# Altium footprint library MS-Electronic.PcbLib: 202 footprints (part 13 of 13)
Each footprint in its own frame and in the unit in brackets; x right, y up, seen from the top. Pads: shape width x height; smd on the part's side, far side on the other; paste and mask are expansions set on the pad; w line width, h text height; cw(c..) or ccw(c..) is an arc to the next point about the centre after c.
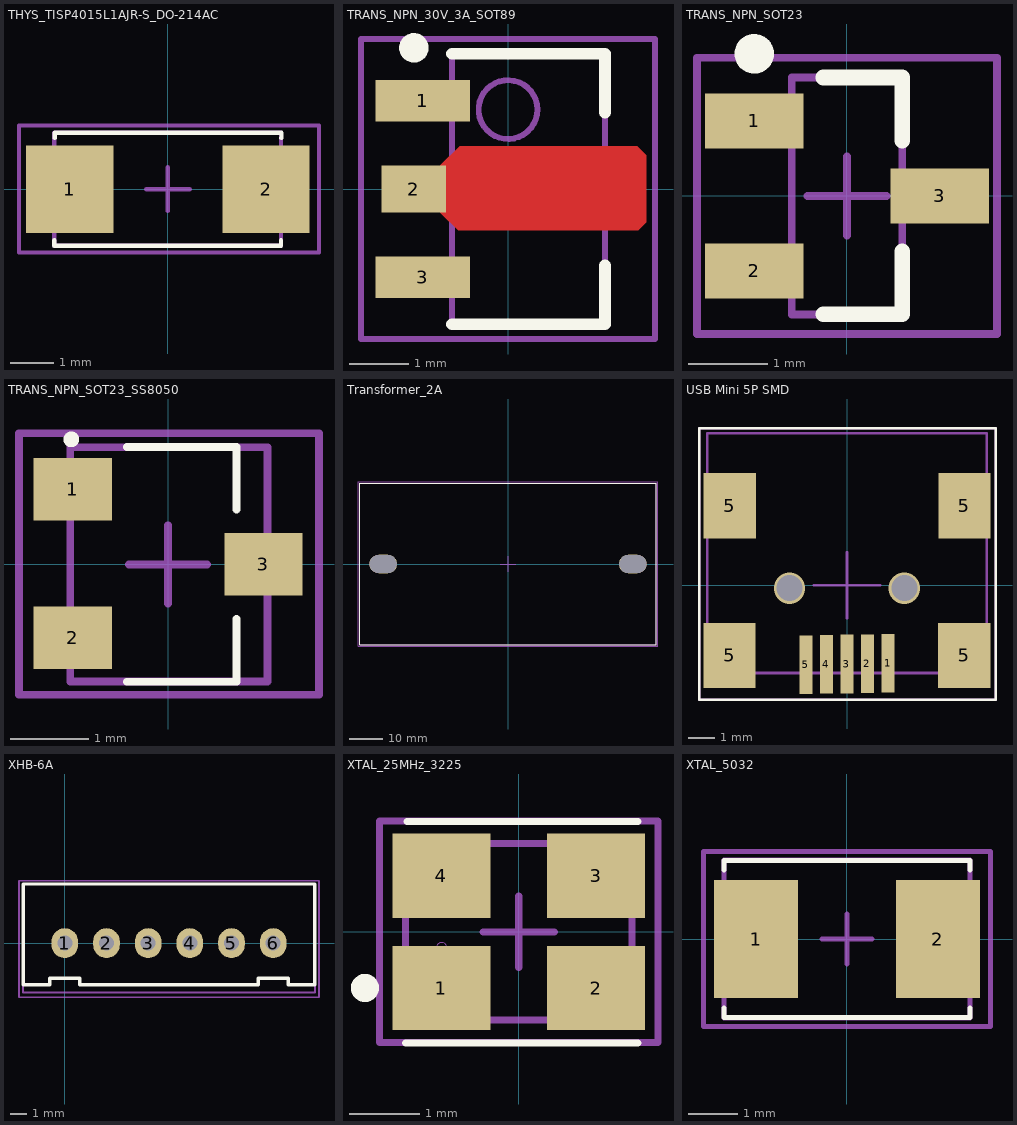
[diagram p12: the footprints below, top view; thin cyan lines are the x and y axes]

## THYS_TISP4015L1AJR-S_DO-214AC [mm]
pads (2):
  rect 2x2 smd mask+0.07: 1(-2.25,0) 2(2.25,0)
Top Overlay:
  lines w0.1: -2.601,-1.172 -2.603,-1.172 -2.603,-1.295 2.591,-1.295 2.591,-1.172 ; -2.591,1.172 -2.591,1.295 2.603,1.295 2.603,1.172 2.601,1.172
Top Assembly:
  lines w0.1: -2.603,-1.295 -2.603,1.295 2.591,1.295 2.591,-1.295 -2.603,-1.295
  text ".Designator" at -3.019,-0.33 h1.4
Top Component Center (Mech15):
  lines w0.1: -0.5,0 0.5,0 ; 0,-0.5 0,0.5 ; -3.414,-1.452 -3.414,1.458 3.463,1.458 3.463,-1.452 -3.414,-1.452
3D body "SMA_nominal.stp": height 2.42, standoff 0.02, extent -2.615,-1.3 2.585,1.3

## TRANS_NPN_30V_3A_SOT89 [mm]
height 1.6
pads (3):
  rect 1.6x0.7 smd: 1(-1.45,1.5) 3(-1.45,-1.5)
  rect 1.1x0.8 smd: 2(-1.6,0)
Top Layer:
  region: -1.15,0.4 -0.824,0.726 2.198,0.726 2.353,0.57 2.353,-0.563 2.212,-0.705 -0.845,-0.705 -1.15,-0.4
Top Overlay:
  circle w0.25: c-1.6,2.4 r0.125
  lines w0.2: -0.95,-2.3 1.65,-2.3 1.65,-1.3 ; -0.95,2.3 1.65,2.3 1.65,1.3
Top Assembly:
  circle w0.1: c0,1.35 r0.5
  lines w0.1: -0.95,-2.3 -0.95,2.3 1.65,2.3 1.65,-2.3 -0.95,-2.3
  text ".Designator" at -2.999,-0.2 h0.6
Top Component Center (Mech15):
  lines w0.1: -0.15,0 0.85,0 ; 0.35,-0.5 0.35,0.5 ; -2.5,-2.55 -2.5,2.55 2.5,2.55 2.5,-2.55 -2.5,-2.55
3D body "TRANS_NPN_30V_3A_SOT89.step": height 1.6, standoff 0, extent -2.202,-2.329 1.948,2.264

## TRANS_NPN_SOT23 [mm]
height 1.2
pads (3):
  rect 1.25x0.7 smd: 1(-1.175,0.95) 2(-1.175,-0.95) 3(1.175,0)
Top Overlay:
  circle w0.25: c-1.175,1.8 r0.125
  lines w0.2: -0.3,-1.5 0.7,-1.5 0.7,-0.7 ; -0.3,1.5 0.7,1.5 0.7,0.7
Top Assembly:
  lines w0.1: -0.7,-1.5 -0.7,1.5 0.7,1.5 0.7,-1.5 -0.7,-1.5
  text ".Designator" at -2.999,-0.2 h0.6
Top Component Center (Mech15):
  lines w0.1: -0.5,0 0.5,0 ; 0,-0.5 0,0.5 ; -1.9,-1.75 -1.9,1.75 1.9,1.75 1.9,-1.75 -1.9,-1.75
3D body "TRANS_NPN_SOT23.step": height 1.2, standoff 0, extent -1.3,-1.5 1.3,1.5

## TRANS_NPN_SOT23_SS8050 [mm]
pads (3):
  rect 1x0.8 smd: 1(-1.219,0.96) 2(-1.219,-0.94) 3(1.219,0)
Top Overlay:
  circle w0.1: c-1.236,1.599 r0.05
  lines w0.1: -0.525,-1.5 0.875,-1.5 0.875,-0.7 ; -0.525,1.5 0.875,1.5 0.875,0.7
Top Assembly:
  lines w0.1: -1.251,-1.499 1.27,-1.499 1.27,1.499 -1.251,1.499 -1.251,-1.499
  text ".Designator" at -2.999,-0.2 h0.6
Top Component Center (Mech15):
  lines w0.1: -0.5,0 0.5,0 ; 0,-0.5 0,0.5 ; -1.905,-1.666 -1.905,1.676 1.93,1.676 1.93,-1.666 -1.905,-1.666
3D body "SW3DPS-SOT-23-DEFAULT.STEP": height 1.1, standoff 0, extent -1.25,-1.5 1.25,1.5

## TRANS_NPN_SOT89 [mm]

## Transformer_2A [mm]
pads (2):
  oval 8.2x5.5 hole 5.25 slot 8 at 0 deg: ""(-37,0) ""(37,0)
Top Overlay:
  lines w0.2: -44,-24 -44,0 -44,24 44,24 44,0 44,-24 -44,-24
Top Assembly:
  lines w0.2: -44,-24 44,-24 44,24 -44,24 -44,-24
  text ".Designator" at -4.998,-0.333 h1
Top Component Center (Mech15):
  lines w0.1: -2.286,0 0,0 ; 0,-2.286 0,0 ; 0,2.286 0,0 ; 2.286,0 0,0 ; -44.45,-24.384 44.45,-24.384 44.45,24.388 -44.45,24.388 -44.45,-24.384
3D body: height 52, standoff 0, extent -44,-24 44,24

## USB Mini 5P SMD [mm]
pads (9):
  rect 0.5x2.25 smd: 1(1.573,-2.997) 2(0.785,-3.01) 3(-0.002,-3.023) 4(-0.79,-3.035) 5(-1.577,-3.048)
  rect 2x2.5 smd: 5(-4.502,-2.692) 5(-4.498,3.048) 5(4.498,-2.692) 5(4.502,3.048)
via 2.198,-0.112 diameter 1.2 hole 1
via -2.202,-0.112 diameter 1.2 hole 1
Top Overlay:
  lines w0.1: -5.666,-4.394 -5.666,6.02 5.702,6.02 5.702,-4.394 -5.666,-4.394
Top Assembly:
  lines w0.1: -5.356,-3.366 -5.356,5.833 5.352,5.833 5.352,-3.366 -5.356,-3.366
  text ".Designator" at -3.999,-0.267 h0.8
Top Component Center (Mech15):
  lines w0.1: -1.27,0 0,0 ; 0,-1.27 0,0 ; 0,1.27 0,0 ; 1.27,0 0,0 ; -5.666,-4.394 -5.666,6.02 5.702,6.02 5.702,-4.394 -5.666,-4.394
3D body "User Library-USB_mini_B.step": height 3.95, standoff -1, extent -5.352,-3.365 5.348,5.835

## XHB-6A [mm]
pads (6):
  oval 1.6x1.8 hole 0.9: 1(0,0) 2(2.5,0) 3(5,0) 4(7.5,0) 5(10,0) 6(12.5,0)
Top Overlay:
  lines w0.2: -2.5,-2.5 -0.9,-2.5 -0.9,-2.1 0.9,-2.1 0.9,-2.5 11.6,-2.5 11.6,-2.1 13.4,-2.1 13.4,-2.5 15,-2.5 15,3.55 -2.5,3.55 -2.5,-2.5
Top Assembly:
  lines w0.127: -2.5,-2.95 -2.5,3.55 15,3.55 15,-2.95 -2.5,-2.95
  text ".Designator" at -2.499,-0.167 h0.5
Top Component Center (Mech15):
  lines w0.1: -0.762,0 0,0 ; 0,-0.762 0,0 ; 0,0.762 0,0 ; 0.762,0 0,0 ; -2.75,-3.25 15.25,-3.25 15.25,3.75 -2.75,3.75 -2.75,-3.25
3D body "x8821wv-06l-n0sn.stp": height 2.8, standoff -7.8, extent -2.5,-2.954 15,3.55

## XTAL_25MHz_3225 [mm]
height 0.9
pads (4):
  rect 1.4x1.2 smd paste+0: 1(-1.1,-0.8) 2(1.1,-0.8) 3(1.1,0.8) 4(-1.1,0.8)
Top Overlay:
  circle w0.2: c-2.188,-0.799 r0.1
  lines w0.1: -1.61,-1.581 1.697,-1.581 ; -1.593,1.574 1.697,1.574
Top Assembly:
  lines w0.1: -1.6,-0.635 cw(c-1.638,-1.206) -1.067,-1.245 ; -1.615,-1.256 1.609,-1.256 1.609,1.254 -1.615,1.254 -1.615,-1.256
  text ".Designator" at -2.999,-0.2 h0.6
Top 3D Body:
  circle w0: c-1.1,-0.228 r0.076
Top Component Center (Mech15):
  lines w0.1: -0.508,0 0,0 ; 0,-0.508 0,0 ; 0,0.508 0,0 ; 0.508,0 0,0 ; -1.979,-1.578 1.982,-1.578 1.982,1.575 -1.979,1.575 -1.979,-1.578
3D body "TSX-3225_24.0000MF20G-AC0.step": height 0.6, standoff 0, extent -1.6,-1.25 1.6,1.25

## XTAL_5032 [mm]
pads (2):
  rect 1.7x2.4 smd: 1(-1.85,0) 2(1.85,0)
Top Overlay:
  lines w0.1: -2.5,-1.4 -2.5,-1.6 2.5,-1.6 2.5,-1.4 ; -2.5,1.4 -2.5,1.6 2.5,1.6 2.5,1.4
Top Assembly:
  lines w0.1: -2.501,-1.61 -2.501,1.603 2.502,1.603 2.502,-1.61 -2.501,-1.61
  text ".Designator" at -2.499,-0.167 h0.5
Top Component Center (Mech15):
  lines w0.1: -0.508,0 0,0 ; 0,-0.508 0,0 ; 0,0.508 0,0 ; 0.508,0 0,0 ; -2.921,-1.778 -2.921,1.778 2.921,1.778 2.921,-1.778 -2.921,-1.778
3D body "crystal 8MHz.stp": height 1.2, standoff 0, extent -2.5,-1.6 2.5,1.6